# Altium footprint library TSC Footprints.PcbLib: 99 footprints (part 6 of 7)
Each footprint in its own frame and in the unit in brackets; x right, y up, seen from the top. Pads: shape width x height; smd on the part's side, far side on the other; paste and mask are expansions set on the pad; w line width, h text height; cw(c..) or ccw(c..) is an arc to the next point about the centre after c.
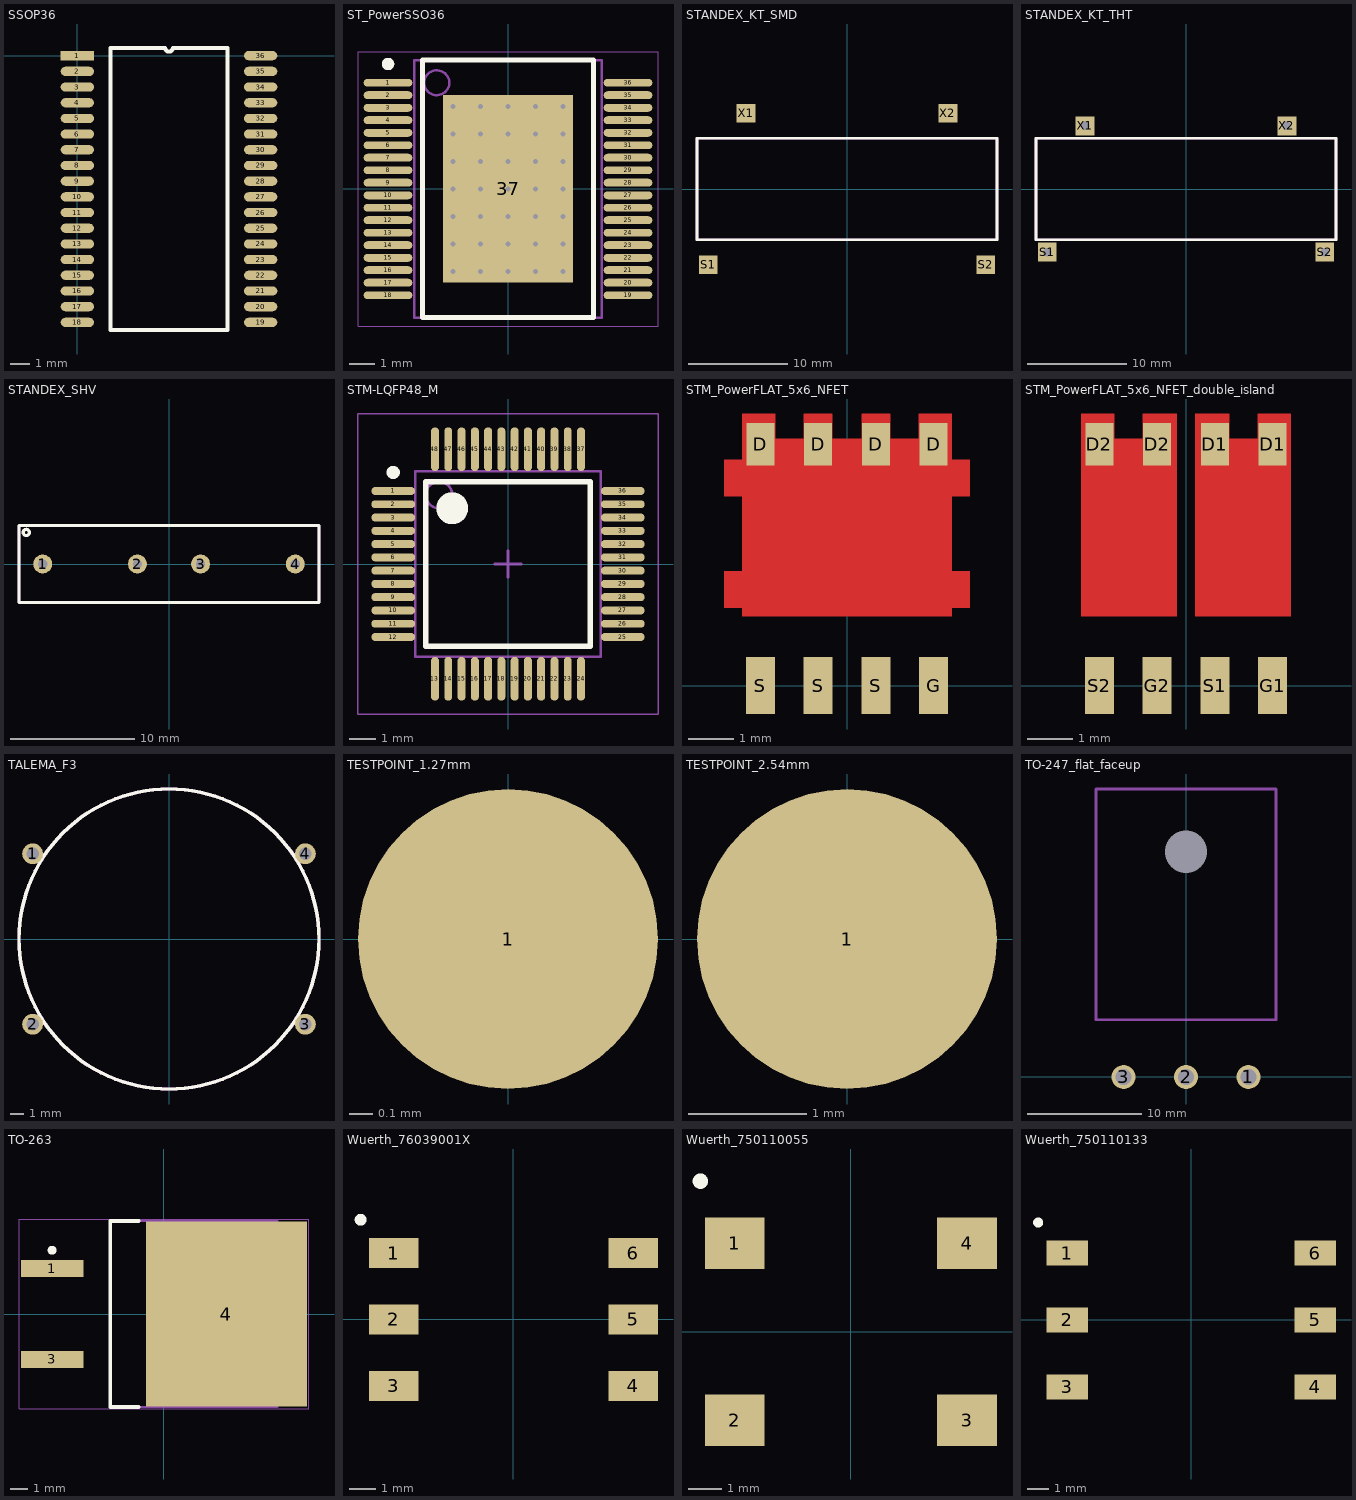
[diagram p5: the footprints below, top view; thin cyan lines are the x and y axes]

## SSOP36 [mm]
pads (36):
  rect 1.7x0.47 smd: 1(0,0)
  oval 1.7x0.47 smd: 2(0,-0.8) 3(0,-1.6) 4(0,-2.4) 5(0,-3.2) 6(0,-4) 7(0,-4.8) 8(0,-5.6) 9(0,-6.4) 10(0,-7.2) 11(0,-8) 12(0,-8.8) 13(0,-9.6) 14(0,-10.4) 15(0,-11.2) 16(0,-12) 17(0,-12.8) 18(0,-13.6) 19(9.35,-13.6) 20(9.35,-12.8) 21(9.35,-12) 22(9.35,-11.2) 23(9.35,-10.4) 24(9.35,-9.6) 25(9.35,-8.8) 26(9.35,-8) 27(9.35,-7.2) 28(9.35,-6.4) 29(9.35,-5.6) 30(9.35,-4.8) 31(9.35,-4) 32(9.35,-3.2) 33(9.35,-2.4) 34(9.35,-1.6) 35(9.35,-0.8) 36(9.35,0)
Top Overlay:
  lines w0.2: 1.685,-14 1.685,0.4 4.475,0.4 ccw(c4.675,0.4) 4.875,0.4 7.665,0.4 7.665,-14 1.685,-14

## ST_PowerSSO36 [mm] "STMicro PowerSSO36"
height 2.45
pads (37):
  oval 1.95x0.32 smd: 1(-4.8,4.25) 2(-4.8,3.75) 3(-4.8,3.25) 4(-4.8,2.75) 5(-4.8,2.25) 6(-4.8,1.75) 7(-4.8,1.25) 8(-4.8,0.75) 9(-4.8,0.25) 10(-4.8,-0.25) 11(-4.8,-0.75) 12(-4.8,-1.25) 13(-4.8,-1.75) 14(-4.8,-2.25) 15(-4.8,-2.75) 16(-4.8,-3.25) 17(-4.8,-3.75) 18(-4.8,-4.25) 19(4.8,-4.25) 20(4.8,-3.75) 21(4.8,-3.25) 22(4.8,-2.75) 23(4.8,-2.25) 24(4.8,-1.75) 25(4.8,-1.25) 26(4.8,-0.75) 27(4.8,-0.25) 28(4.8,0.25) 29(4.8,0.75) 30(4.8,1.25) 31(4.8,1.75) 32(4.8,2.25) 33(4.8,2.75) 34(4.8,3.25) 35(4.8,3.75) 36(4.8,4.25)
  rect 5.2x7.5 smd: 37(0,0)
via -2.2,3.3 diameter 0.5 hole 0.2
via -1.1,3.3 diameter 0.5 hole 0.2
via 0,3.3 diameter 0.5 hole 0.2
via 1.1,3.3 diameter 0.5 hole 0.2
via 2.2,3.3 diameter 0.5 hole 0.2
via -2.2,2.2 diameter 0.5 hole 0.2
via -1.1,2.2 diameter 0.5 hole 0.2
via 0,2.2 diameter 0.5 hole 0.2
via 1.1,2.2 diameter 0.5 hole 0.2
via 2.2,2.2 diameter 0.5 hole 0.2
via -2.2,1.1 diameter 0.5 hole 0.2
via -1.1,1.1 diameter 0.5 hole 0.2
via 0,1.1 diameter 0.5 hole 0.2
via 1.1,1.1 diameter 0.5 hole 0.2
via 2.2,1.1 diameter 0.5 hole 0.2
via -2.2,0 diameter 0.5 hole 0.2
via -1.1,0 diameter 0.5 hole 0.2
via 0,0 diameter 0.5 hole 0.2
via 1.1,0 diameter 0.5 hole 0.2
via 2.2,0 diameter 0.5 hole 0.2
via -2.2,-1.1 diameter 0.5 hole 0.2
via -1.1,-1.1 diameter 0.5 hole 0.2
via 0,-1.1 diameter 0.5 hole 0.2
via 1.1,-1.1 diameter 0.5 hole 0.2
via 2.2,-1.1 diameter 0.5 hole 0.2
via -2.2,-2.2 diameter 0.5 hole 0.2
via -1.1,-2.2 diameter 0.5 hole 0.2
via 0,-2.2 diameter 0.5 hole 0.2
via 1.1,-2.2 diameter 0.5 hole 0.2
via 2.2,-2.2 diameter 0.5 hole 0.2
via -2.2,-3.3 diameter 0.5 hole 0.2
via -1.1,-3.3 diameter 0.5 hole 0.2
via 0,-3.3 diameter 0.5 hole 0.2
via 1.1,-3.3 diameter 0.5 hole 0.2
via 2.2,-3.3 diameter 0.5 hole 0.2
Top Overlay:
  circle w0.25: c-4.8,5 r0.125
  lines w0.2: -3.425,-5.15 -3.425,5.15 3.425,5.15 3.425,-5.15 -3.425,-5.15
Mechanical 13:
  circle w0.1: c-2.85,4.25 r0.5
  lines w0.1: -3.75,-5.15 -3.75,5.15 3.75,5.15 3.75,-5.15 -3.75,-5.15
Mechanical 15:
  lines w0.05: -6,-5.5 -6,5.5 6,5.5 6,-5.5 -6,-5.5
  lines w0.1: -0.5,0 0.5,0 ; 0,-0.5 0,0.5
3D body "ST_PowerSSO36.step": height 2.45, standoff 0, extent -5.15,-5.15 5.15,5.15

## STANDEX_KT_SMD [mm] "HV Reed Relay"
height 8.7
pads (4):
  rect 1.9x1.9 smd: S1(-13.97,-7.62) S2(13.97,-7.62) X1(-10.15,7.62) X2(10.15,7.62)
Top Overlay:
  lines w0.254: -15.1,-5.1 -15.1,5.1 15.1,5.1 15.1,-5.1 -15.1,-5.1
Mechanical 1:
  lines w0.254: -15.1,-5.1 15.1,-5.1 15.1,5.1 -15.1,5.1 -15.1,-5.1
3D body: height 8.7, standoff 0, extent -15.1,-5.1 15.1,5.1

## STANDEX_KT_THT [mm] "HV Reed Relay"
height 8.7
pads (4):
  rect 1.9x1.9 hole 0.85: S1(-13.97,-6.35) S2(13.97,-6.35) X1(-10.15,6.35) X2(10.15,6.35)
Top Overlay:
  lines w0.254: -15.1,-5.1 15.1,-5.1 15.1,5.1 -15.1,5.1 -15.1,-5.1
Mechanical 1:
  lines w0.254: -15.1,-5.1 -15.1,5.1 15.1,5.1 15.1,-5.1 -15.1,-5.1
3D body: height 8.7, standoff 0, extent -15.1,-5.1 15.1,5.1

## STANDEX_SHV [mil] "HV Reed Relay"
height 320.08
pads (4):
  round 60 hole 29.53: 1(-400,0) 2(-100,0) 3(100,0) 4(400,0)
Top Overlay:
  circle w10: c-451.97,100 r9.84
  lines w10: -475,-122.44 -475,122.44 475,122.44 475,-122.44 -475,-122.44
Mechanical 1:
  lines w10: -475,-122.44 475,-122.44 475,122.44 -475,122.44 -475,-122.44
3D body: height 320.08, standoff 0, extent -475,-122.44 475,122.44

## STM-LQFP48_M [mm] "QFP, 48-Leads, Body 7x7mm, Pitch 0.5mm, IPC Low Density"
height 1.6
pads (48):
  oval 1.65x0.3 smd: 1(-4.325,2.75) 2(-4.325,2.25) 3(-4.325,1.75) 4(-4.325,1.25) 5(-4.325,0.75) 6(-4.325,0.25) 7(-4.325,-0.25) 8(-4.325,-0.75) 9(-4.325,-1.25) 10(-4.325,-1.75) 11(-4.325,-2.25) 12(-4.325,-2.75) 25(4.325,-2.75) 26(4.325,-2.25) 27(4.325,-1.75) 28(4.325,-1.25) 29(4.325,-0.75) 30(4.325,-0.25) 31(4.325,0.25) 32(4.325,0.75) 33(4.325,1.25) 34(4.325,1.75) 35(4.325,2.25) 36(4.325,2.75)
  oval 0.3x1.65 smd: 13(-2.75,-4.325) 14(-2.25,-4.325) 15(-1.75,-4.325) 16(-1.25,-4.325) 17(-0.75,-4.325) 18(-0.25,-4.325) 19(0.25,-4.325) 20(0.75,-4.325) 21(1.25,-4.325) 22(1.75,-4.325) 23(2.25,-4.325) 24(2.75,-4.325) 37(2.75,4.325) 38(2.25,4.325) 39(1.75,4.325) 40(1.25,4.325) 41(0.75,4.325) 42(0.25,4.325) 43(-0.25,4.325) 44(-0.75,4.325) 45(-1.25,4.325) 46(-1.75,4.325) 47(-2.25,4.325) 48(-2.75,4.325)
Top Overlay:
  circle w0.6: c-2.1,2.1 r0.3
  circle w0.25: c-4.325,3.45 r0.125
  lines w0.2: -3.1,-3.1 3.1,-3.1 3.1,3.1 -3.1,3.1 -3.1,-3.1
Mechanical 13:
  circle w0.1: c-2.6,2.6 r0.5
  lines w0.1: -3.5,-3.5 3.5,-3.5 3.5,3.5 -3.5,3.5 -3.5,-3.5
Mechanical 15:
  lines w0.05: -5.65,-5.65 5.65,-5.65 5.65,5.65 -5.65,5.65 -5.65,-5.65
  lines w0.1: -0.5,0 0.5,0 ; 0,-0.5 0,0.5
3D body: height 1.6, standoff 0.05, extent -3.5,-3.5 3.5,3.5

## STM_PowerFLAT_5x6_NFET [mm]
height 1
pads (8):
  rect 0.62x0.94 smd paste+0 mask+0: D(-1.905,5.31)
  rect 0.62x0.94 smd mask+0: D(-0.635,5.31) D(0.635,5.31) D(1.905,5.31)
  rect 0.64x1.25 smd mask+0: G(1.905,0) S(-1.905,0) S(-0.635,0) S(0.635,0)
Top Layer:
  region: -2.3,5.975 -1.575,5.975 -1.575,5.425 -0.95,5.425 -0.95,5.975 -0.32,5.975 -0.32,5.425 0.32,5.425 0.32,5.975 0.95,5.975 0.95,5.425 1.575,5.425 1.575,5.975 2.3,5.975 2.3,4.965 2.7,4.965 2.7,4.165 2.3,4.165 2.3,2.515 2.7,2.515 2.7,1.715 2.3,1.715 2.3,1.525 -2.3,1.525 -2.3,1.715 -2.7,1.715 -2.7,2.515 -2.3,2.515 -2.3,4.165 -2.7,4.165 -2.7,4.965 -2.3,4.965
Top Solder:
  region: -2.3,5.975 -1.575,5.975 -1.575,5.425 -0.95,5.425 -0.95,5.975 -0.32,5.975 -0.32,5.425 0.32,5.425 0.32,5.975 0.95,5.975 0.95,5.425 1.575,5.425 1.575,5.975 2.3,5.975 2.3,4.965 2.7,4.965 2.7,4.165 2.3,4.165 2.3,2.515 2.7,2.515 2.7,1.715 2.3,1.715 2.3,1.525 -2.3,1.525 -2.3,1.715 -2.7,1.715 -2.7,2.515 -2.3,2.515 -2.3,4.165 -2.7,4.165 -2.7,4.965 -2.3,4.965
3D body: height 0.8, standoff 0, extent -2.5,-0.2 2.5,5.6

## STM_PowerFLAT_5x6_NFET_double_island [mm]
height 1
pads (8):
  rect 0.62x0.94 smd mask+0: D1(0.635,5.31) D1(1.905,5.31) D2(-0.635,5.31)
  rect 0.62x0.94 smd paste+0 mask+0: D2(-1.905,5.31)
  rect 0.64x1.25 smd mask+0: G1(1.905,0) G2(-0.635,0) S1(0.635,0) S2(-1.905,0)
Top Layer:
  region: 2.3,1.525 2.3,5.975 1.575,5.975 1.575,5.425 0.95,5.425 0.95,5.975 0.2,5.975 0.2,1.525
  region: -2.3,1.525 -2.3,5.975 -1.575,5.975 -1.575,5.425 -0.95,5.425 -0.95,5.975 -0.2,5.975 -0.2,1.525
3D body: height 0.8, standoff 0, extent -2.5,-0.2 2.5,5.6

## TALEMA_F3 [mm] "Talema/Nuvotem common mode choke"
height 15
pads (4):
  round 1.524 hole 0.9: 1(-10,6.25) 2(-10,-6.25) 3(10,-6.25) 4(10,6.25)
Top Overlay:
  circle w0.254: c0,0 r11
Mechanical 1:
  circle w0.254: c0,0 r11
3D body: height 7.5, standoff 0, extent 8.76,-7.497 11.25,-5.002
3D body: height 7.5, standoff 0, extent 8.76,5.003 11.25,7.498
3D body: height 7.5, standoff 0, extent -11.24,5.003 -8.75,7.498
3D body: height 7.5, standoff 0, extent -11.24,-7.497 -8.75,-5.002
3D body: height 15, standoff 0, extent -11.012,-10.997 10.988,10.997

## TESTPOINT_1.27mm [mm] "1.27mm radius testpoint"
pads (1):
  round 1.27 smd: 1(0,0)

## TESTPOINT_2.54mm [mm] "2.54mm radius testpoint"
pads (1):
  round 2.54 smd: 1(0,0)

## TO-247_flat_faceup [mm]
height 5.15
pads (4):
  round 2.1 hole 1.4: 1(5.45,0) 2(0,0) 3(-5.45,0)
  round 0 hole 3.7: ""(0,19.685)
Mechanical 1:
  lines w0.254: -7.875,5 7.875,5 7.875,25.15 -7.875,25.15 -7.875,5
3D body "TO-247H.STEP": height 5.2, standoff -6.7, extent -7.75,-0.25 7.75,25.15

## TO-263 [mm] "D2-PAK, 4-Leads, Body 9.2x10.2mm, Pitch 2.54mm, Lead Span 15.4mm, IPC High Density"
height 4.6
pads (3):
  rect 3.5x0.95 smd: 1(-6.25,2.54) 3(-6.25,-2.54)
  rect 9x10.35 smd: 4(3.5,0)
Top Overlay:
  circle w0.25: c-6.25,3.565 r0.125
  lines w0.2: -1.4,-5.2 -3,-5.2 -3,5.2 -1.4,5.2
Mechanical 13:
  lines w0.1: -3,-5.2 6.35,-5.2 6.35,5.2 -3,5.2 -3,-5.2
Mechanical 15:
  lines w0.05: -8.1,-5.3 8.1,-5.3 8.1,5.3 -8.1,5.3 -8.1,-5.3
  lines w0.1: -0.5,0 0.5,0 ; 0,-0.5 0,0.5
3D body: height 4.6, standoff 0, extent -3,-5.2 6.35,5.2

## Wuerth_76039001X [mm]
height 4.19
pads (6):
  rect 1.9x1.14 smd: 1(-4.57,2.54) 2(-4.57,0) 3(-4.57,-2.54) 4(4.57,-2.54) 5(4.57,0) 6(4.57,2.54)
Top Overlay:
  circle w0.254: c-5.84,3.81 r0.1
3D body "76039001X.STEP": height 4.19, standoff 0, extent -5.07,-3.35 4.98,3.38

## Wuerth_750110055 [mm]
height 3.55
pads (4):
  rect 1.77x1.52 smd: 1(-3.43,2.615) 2(-3.43,-2.615) 3(3.43,-2.615) 4(3.43,2.615)
Top Overlay:
  circle w0.254: c-4.445,4.445 r0.1
3D body: height 3.55, standoff 0, extent -3.81,-3.81 3.81,3.81

## Wuerth_750110133 [mm]
height 7.62
pads (6):
  rect 1.9x1.14 smd: 1(-5.655,3.05) 2(-5.655,0) 3(-5.655,-3.05) 4(5.655,-3.05) 5(5.655,0) 6(5.655,3.05)
Top Overlay:
  circle w0.254: c-6.985,4.445 r0.1
3D body: height 7.62, standoff 0, extent -4,-4.57 4,4.57